# Altium schematic symbol library SignalCommunications.SCHLIB: 804 symbols (part 1 of 9) (continued)
## WE-DDF
designator L?, comment <b>SEPIC SMD Power Transformer WE-DDF</b><br><br> / - Extremely flat<br> / - 1:1 transformer<br> / - Double inductor with two identical windings<br><br> / -- SEPIC-switching regulators<br> / -- Switching regulators with second, / unregulated output voltage
footprint WE-DDF_744876...
pins: 1 3, 2 1, 3 2, 4

## WE-DSL_7505101...
designator T?, comment <b>SMD-VDSL Transformer WE-DSL</b><p> / - IEC60950 compatible<br><br> / -- for VDSL applications<br> / -- Matched to various manufacturers VDSL ICs
footprint WE_EP7_SMD_8PIN
pins: 1, 2, 3, 4, 5, 6, 7, 8

## WE-DSL_75005153X
designator T?, comment <b>SMD-ADSL Transformer WE-DSL</b><p> / - IEC60950 compatible<br><br> / -- for ADSL applications<br> / -- Matched to various manufacturers ADSL ICs
footprint WE_EP7_SMD_8PIN
pins: 1, 2, 3, 4, 5, 6, 7, 8

## WE-DSL_750050702
designator T?, comment <b>SMD-ADSL Transformer WE-DSL</b><p> / - IEC60950 compatible<br><br> / -- for ADSL applications<br> / -- Matched to various manufacturers ADSL ICs
footprint WE_EP13_SMD_9PIN
pins: 1, 2, 4, 5, 6, 7, 8, 9, 10

## WE-DSL_750050772_750051256
designator T?, comment <b>SMD-HDSL Transformer WE-DSL</b><p> / - IEC60950 compatible<br><br> / -- for HDSL applications<br> / -- Matched to various manufacturers HDSL ICs
footprint WE_EP13_THT_9PIN
pins: 1, 2, 4, 5, 6, 7, 8, 9, 10

## WE-DSL_750051062_750051576
designator T?, comment <b>SMD-HDSL Transformer WE-DSL</b><p> / - IEC60950 compatible<br><br> / -- for HDSL applications<br> / -- Matched to various manufacturers HDSL ICs
footprint WE_EP13_SMD_9PIN
pins: 1, 2, 4, 5, 6, 7, 8, 9, 10

## WE-DSL_750051433
designator T?, comment <b>SMD-SHDSL Transformer WE-DSL</b><p> / - IEC60950 compatible<br><br> / -- for SHDSL applications<br> / -- Matched to various manufacturers SHDSL ICs
footprint WE_EP13_THT_9PIN
pins: 1, 2, 4, 5, 6, 7, 8, 9, 10

## WE-DSL_750051719
designator T?, comment <b>SMD-SHDSL Transformer WE-DSL</b><p> / - IEC60950 compatible<br><br> / -- for SHDSL applications<br> / -- Matched to various manufacturers SHDSL ICs
footprint WE_EPX9_SMD_8PIN
pins: 1, 2, 3, 4, 5, 6, 7, 8

## WE-DSL_750051786_7500521..
designator T?, comment <b>SMD-ADSL Transformer WE-DSL</b><p> / - IEC60950 compatible<br><br> / -- for ADSL applications<br> / -- Matched to various manufacturers ADSL ICs
footprint WE_EP13_SMD_12PIN
pins: 1, 2, 3, 4, 5, 6, 7, 8, 9, 10, 14 11, 16 12

## WE-EHPI
designator L?, comment <b>Energy Harvesting Coupled Inductor WE-EHPI</b><p> / - Low profile: 4 mm <br> / - Small footprint 6 x 6 mm <br> / - Very low secondary RDC<br> / - Multiple options of turn ratios available <br> / - Separated welding/soldering pads for increased reliability<br> / - Optimized winding technology for increased performance & reliability<br> / <br> / - Wireless fire, alarm, gas and metering remote sensors driven by environmental energies based on energy harvesting <br> / - Sensors with predictive battery replacements in applications which are difficult to access <br> / - Energy self-sufficient supply using subsequent installed sensors for energy harvesting <br>
MANUFACTURER: Würth Elektronik eiSos GmbH; CREATED-BY: Christin Otto; COMPANY-URL: http://we-online.de; CREATED-DATE: March 2013; DATASHEET-URL: http://katalog.we-online.de/de/pbs/WE-EHPI?sid=1d9d32b2a9
footprint WE-EHPI
pins: 1 3, 2 4, 3 2, 4 1

## WE-FB_LT35XX/LT3748_EP5_EP5
designator T?, comment <b>Flyback Converter WE-FB for LT35xx / LT3748</b><p> / - Input voltage: 8-15 V<br> / - Output power: <10 W<br> / - Isolation voltage: 2.5 kV<br> / - designd for LT35xx / LT3748<br><br> / -- Industrial input voltage
footprint WE_EP5_SMD_6PIN
pins: 1, 3, 4, 6

## WE-FB_LT3573_WE-FB_750370047
designator T?, comment <b>Flyback Converter WE-FB for LT3573</b><p> / - Input voltage: 24 V<br> / - Output power: 5 W<br> / - Isolation voltage: 1.5 kV<br> / - designd for LT3573<br><br> / -- Industrial input voltage
footprint WE_EP7*_750370047
pins: 1, 2, 3, 4, 5, 6, 7, 8

## WE-FB_LT3573_WE-FB_750370058_750370059
designator T?, comment <b>Flyback Converter WE-FB for LT3573</b><p> / - Input voltage: 24 V<br> / - Output power: 5 W<br> / - Isolation voltage: 1.5 kV<br> / - designd for LT3573<br><br> / -- Industrial input voltage
footprint WE_EP7*_750370058_750370059
pins: 1, 2, 3, 4, 5, 6, 7, 8

## WE-FB_LT3573_WE-FB_EP7
designator T?, comment <b>Flyback Converter WE-FB for LT3573</b><p> / - Input voltage: 24 V<br> / - Output power: 5 W<br> / - Isolation voltage: 1.5 kV<br> / - designd for LT3573<br><br> / -- Industrial input voltage
footprint WE_EP7_SMD_8PIN
pins: 1, 2, 3, 4, 5, 6, 7, 8

## WE-FB_LT3573_WE-FB_EP10
designator T?, comment <b>Flyback Converter WE-FB for LT3573</b><p> / - Input voltage: 24 V<br> / - Output power: 5 W<br> / - Isolation voltage: 1.5 kV<br> / - designd for LT3573<br><br> / -- Industrial input voltage
footprint WE_EP10_SMD_8PIN
pins: 1, 2, 3, 4, 5, 6, 7, 8

## WE-FB_LT3573_WE-FB_ER9.5
designator T?, comment <b>Flyback Converter WE-FB for LT3573</b><p> / - Input voltage: 24 V<br> / - Output power: 5 W<br> / - Isolation voltage: 1.5 kV<br> / - designd for LT3573<br><br> / -- Industrial input voltage
footprint WE_ER9.5_SMD_8PIN
pins: 1 4, 2 3, 3 2, 4 1, 5 8, 6 7, 7 6, 8 5

## WE-FB_LT3751_EE35/18/10
designator T?, comment <b>Flyback Converter WE-FB for LT3751</b><p> / - designd for LT3751<br><br>
footprint WE_EE35/18/10_THT_HORIZONTAL_14PIN
pins: 1, 2, 3, 4, 5, 6, 7, 8, 9, 10, 11, 12, 13, 14

## WE-FB_LT3751_EFD20
designator T?, comment <b>Flyback Converter WE-FB for LT3751</b><p> / - designd for LT3751<br><br>
footprint WE_EFD20_SMD_10PIN
pins: 1, 2, 3, 4, 5, 6, 7, 8, 9, 10

## WE-FC_ET
designator L?, comment <b>Current Compensated Power Line Choke WE-FC</b><p> / - Closed rectangular ferrit core<br> / - 2-section winding for excellent high frequency performance<br> / - 1% stray inductance for symmetrical interference suppression<br> / - Recyclable due to no encapsulation<br> / - Rated voltage 250 VAC<br> / - Isolation voltage 2000 VAC<br><br> / -- Switch mode power supplies<br> / -- Electronic ballasts for lamps
footprint WE-FC_ET
pins: 1 3, 2 4, 3 2, 4 1

## WE-FC_UT
designator L?, comment <b>Current Compensated Power Line Choke WE-FC</b><p> / - Closed rectangular ferrit core<br> / - 2-section winding for excellent high frequency performance<br> / - 1% stray inductance for symmetrical interference suppression<br> / - Recyclable due to no encapsulation<br> / - Rated voltage 250 VAC<br> / - Isolation voltage 2000 VAC<br><br> / -- Switch mode power supplies<br> / -- Electronic ballasts for lamps
footprint WE-FC_UT
pins: 1 3, 2 4, 3 2, 4 1

## WE-FLEX+_ETD29
designator T?, comment <b>FLEX-Transformer WE-FLEX+</b><p> / - Transformer with 6 windings<br> / - Power up to 300W / - Insulation voltage 500 VDC<br> / - Low leakage inductance<br><br> / -- For all kinds of switching regulators: Flyback converters, Forward converters, Push- pull converters, SEPIC converter
footprint WE_ETD29_THT_14PIN
pins: 1 9, 2 11, 3 1, 5 3, 6 5, 7, 8, 9 6, 10 4, 12 2, 13 12, 14 10

## WE-FLEX+_ETD34
designator T?, comment <b>FLEX-Transformer WE-FLEX+</b><p> / - Transformer with 6 windings<br> / - Power up to 300W / - Insulation voltage 500 VDC<br> / - Low leakage inductance<br><br> / -- For all kinds of switching regulators: Flyback converters, Forward converters, Push- pull converters, SEPIC converter
footprint WE_ETD34_THT_14PIN
pins: 1 9, 2 11, 3 1, 5 3, 6 5, 7, 8, 9 6, 10 4, 12 2, 13 12, 14 10

## WE-FLEX+_ETD39
designator T?, comment <b>FLEX-Transformer WE-FLEX+</b><p> / - Transformer with 6 windings<br> / - Power up to 300W / - Insulation voltage 500 VDC<br> / - Low leakage inductance<br><br> / -- For all kinds of switching regulators: Flyback converters, Forward converters, Push- pull converters, SEPIC converter
footprint WE_ETD39_THT_16PIN
pins: 2 9, 3 11, 4 1, 5 3, 6 5, 7, 10 8, 11 6, 12 4, 13 2, 14 12, 15 10

## WE-FLEX_EFD15
designator T?, comment <b>FLEX-Transformer WE-FLEX</b><p> / Transformer with 6 windings<br> / - 4 sizes with 5 different lengths of air gap each<br> / - Insulation voltage 500 VDC<br> / - Low leakage inductance<br><br> / -- By using different circuits more than 300 transformer solutions and about 100 choke solution possible <br> / -- For all kinds of switching regulators: Flyback converters, Forward converters, Push- pull converters, SEPIC converter
footprint WE_EFD15_SMD_12PIN
pins: 1, 2 3, 3 5, 4 7, 5 9, 6 11, 7 12, 8 10, 9 8, 10 6, 11 4, 12 2

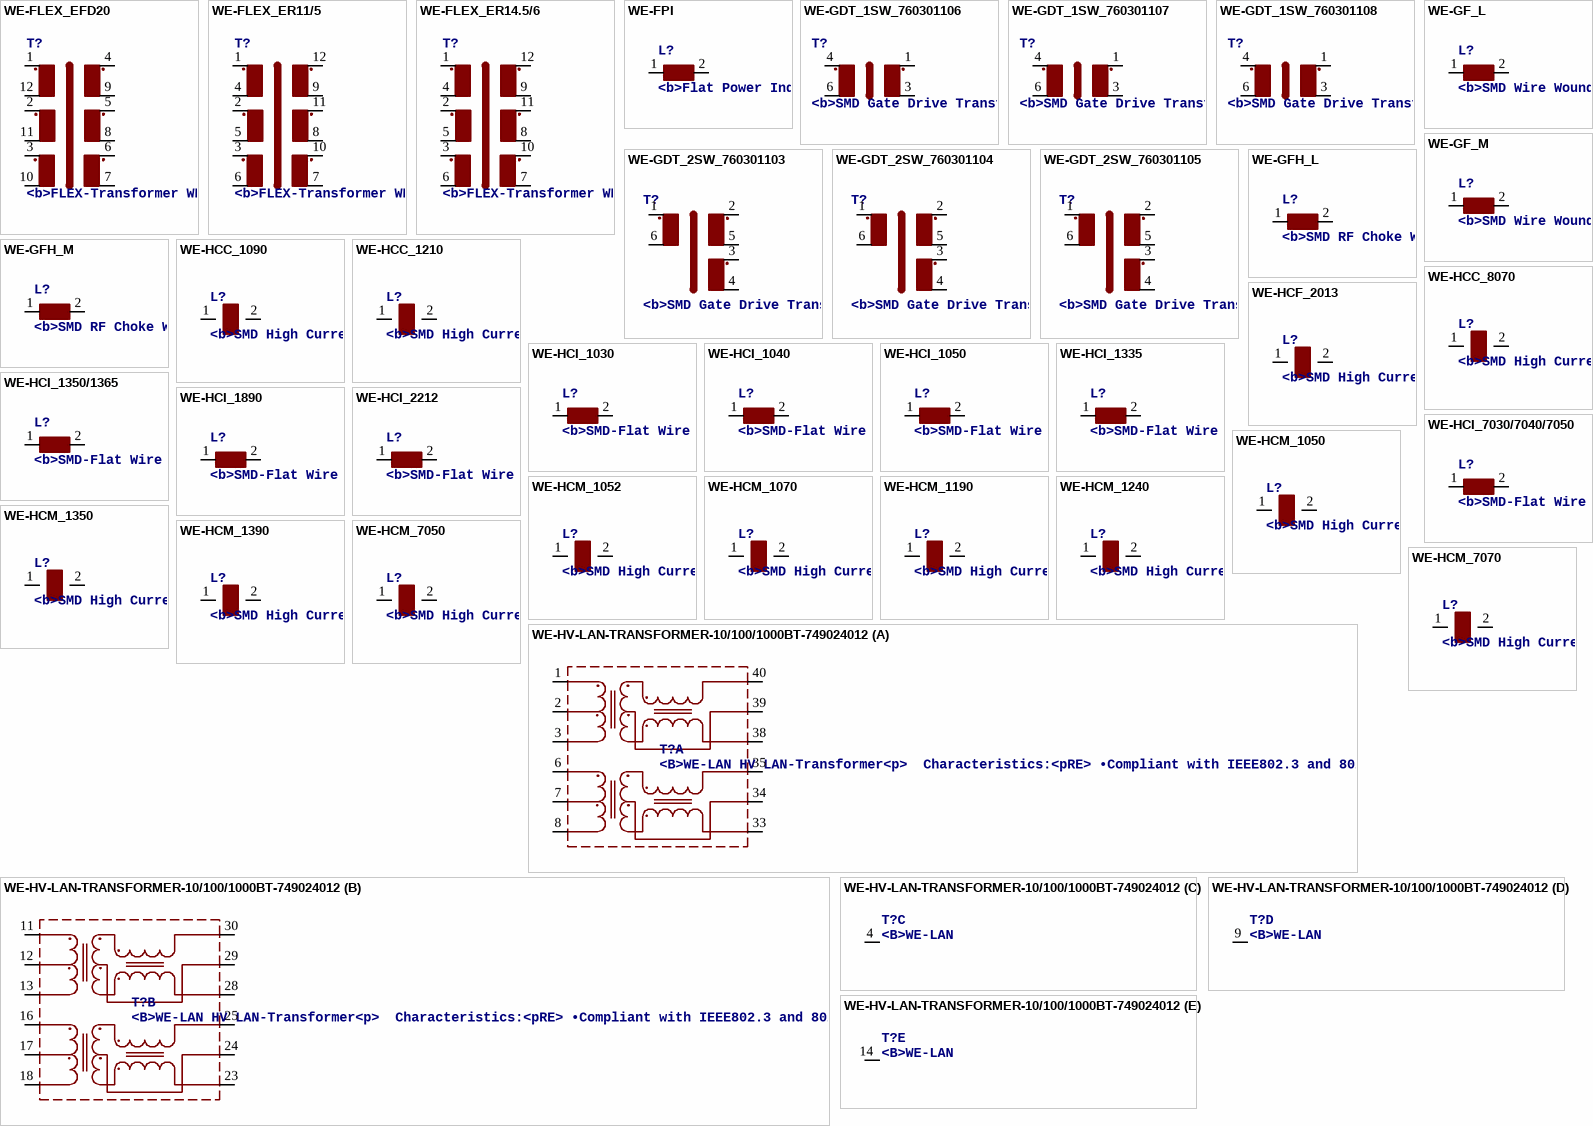
[diagram p2: symbols WE-FLEX_EFD20 to WE-HV-LAN-TRANSFORMER-10/100/1000BT-749024012]

## WE-FLEX_EFD20
designator T?, comment <b>FLEX-Transformer WE-FLEX</b><p> / Transformer with 6 windings<br> / - 4 sizes with 5 different lengths of air gap each<br> / - Insulation voltage 500 VDC<br> / - Low leakage inductance<br><br> / -- By using different circuits more than 300 transformer solutions and about 100 choke solution possible <br> / -- For all kinds of switching regulators: Flyback converters, Forward converters, Push- pull converters, SEPIC converter
footprint WE_EFD20_SMD_12PIN
pins: 1, 2 3, 3 5, 4 7, 5 9, 6 11, 7 12, 8 10, 9 8, 10 6, 11 4, 12 2

## WE-FLEX_ER11/5
designator T?, comment <b>FLEX-Transformer WE-FLEX</b><p> / Transformer with 6 windings<br> / - 4 sizes with 5 different lengths of air gap each<br> / - Insulation voltage 500 VDC<br> / - Low leakage inductance<br><br> / -- By using different circuits more than 300 transformer solutions and about 100 choke solution possible <br> / -- For all kinds of switching regulators: Flyback converters, Forward converters, Push- pull converters, SEPIC converter
footprint WE_ER11/5_SMD_12PIN
pins: 1, 2 3, 3 5, 4 2, 5 4, 6, 7 12, 8 10, 9 8, 10 11, 11 9, 12 7

## WE-FLEX_ER14.5/6
designator T?, comment <b>FLEX-Transformer WE-FLEX</b><p> / Transformer with 6 windings<br> / - 4 sizes with 5 different lengths of air gap each<br> / - Insulation voltage 500 VDC<br> / - Low leakage inductance<br><br> / -- By using different circuits more than 300 transformer solutions and about 100 choke solution possible <br> / -- For all kinds of switching regulators: Flyback converters, Forward converters, Push- pull converters, SEPIC converter
footprint WE_ER14.5/6_SMD_12PIN
pins: 1, 2 3, 3 5, 4 2, 5 4, 6, 7 12, 8 10, 9 8, 10 11, 11 9, 12 7

## WE-FPI
designator L?, comment <b>Flat Power Inductor WE-FPI</b><br><br> / - Extremely flat power inductor <= 1,1 mm<br> / - High current capability<br> / -- Portable power like PDA, digital camera, / PCMICA-cards and displays<br> / -- DC/DC-converter<br> / -- Recommended for switching regulator IC's from / Linear Technology, National Semiconductor, / Texas Instruments and Fairchild Semiconductor
footprint WE-FPI_744010...
pins: 1, 2

## WE-GDT_1SW_760301106
designator T?, comment <b>SMD Gate Drive Transformer WE-GDT</b><br><br> / - small form factor EP5<br> / - 1 or 2 secondary windings<br> / - 4 different turn rations<br> / - 1500VDC insulation test voltage<br> / - operating voltage up to 80V<br><br> / -- Gate Drive<br> / -- Signal<br> / -- Power<br> / -- Synchronous Flyback
footprint WE_EP5_SMD_6PIN
pins: 1 6, 3 4, 4 1, 6 3

## WE-GDT_1SW_760301107
designator T?, comment <b>SMD Gate Drive Transformer WE-GDT</b><br><br> / - small form factor EP5<br> / - 1 or 2 secondary windings<br> / - 4 different turn rations<br> / - 1500VDC insulation test voltage<br> / - operating voltage up to 80V<br><br> / -- Gate Drive<br> / -- Signal<br> / -- Power<br> / -- Synchronous Flyback
footprint WE_EP5_SMD_6PIN
pins: 1 6, 3 4, 4 1, 6 3

## WE-GDT_1SW_760301108
designator T?, comment <b>SMD Gate Drive Transformer WE-GDT</b><br><br> / - small form factor EP5<br> / - 1 or 2 secondary windings<br> / - 4 different turn rations<br> / - 1500VDC insulation test voltage<br> / - operating voltage up to 80V<br><br> / -- Gate Drive<br> / -- Signal<br> / -- Power<br> / -- Synchronous Flyback
footprint WE_EP5_SMD_6PIN
pins: 1 6, 3 4, 4 1, 6 3

## WE-GDT_2SW_760301103
designator T?, comment <b>SMD Gate Drive Transformer WE-GDT</b><br><br> / - small form factor EP5<br> / - 1 or 2 secondary windings<br> / - 4 different turn rations<br> / - 1500VDC insulation test voltage<br> / - operating voltage up to 80V<br><br> / -- Gate Drive<br> / -- Signal<br> / -- Power<br> / -- Synchronous Flyback
footprint WE_EP5_SMD_6PIN
pins: 1, 2 3, 3 5, 4 6, 5 4, 6 2

## WE-GDT_2SW_760301104
designator T?, comment <b>SMD Gate Drive Transformer WE-GDT</b><br><br> / - small form factor EP5<br> / - 1 or 2 secondary windings<br> / - 4 different turn rations<br> / - 1500VDC insulation test voltage<br> / - operating voltage up to 80V<br><br> / -- Gate Drive<br> / -- Signal<br> / -- Power<br> / -- Synchronous Flyback
footprint WE_EP5_SMD_6PIN
pins: 1, 2 3, 3 5, 4 6, 5 4, 6 2

## WE-GDT_2SW_760301105
designator T?, comment <b>SMD Gate Drive Transformer WE-GDT</b><br><br> / - small form factor EP5<br> / - 1 or 2 secondary windings<br> / - 4 different turn rations<br> / - 1500VDC insulation test voltage<br> / - operating voltage up to 80V<br><br> / -- Gate Drive<br> / -- Signal<br> / -- Power<br> / -- Synchronous Flyback
footprint WE_EP5_SMD_6PIN
pins: 1, 2 3, 3 5, 4 6, 5 4, 6 2

## WE-GF_L
designator L?, comment <b>SMD Wire Wound Inductor WE-GF</b><p> / - Wire wound ferrite<br> / - High resistance against dampness<br> / - 5% tolerance is available upon request<p> / -- HF-circuits like tuner, transponder etc.<br> / -- HF amplifier circuits like antennas amplifier<br> / -- Oscillator<br> / -- Filter circuits<br> / -- Amplification circuits
footprint WE-GF_L
pins: 1, 2

## WE-GF_M
designator L?, comment <b>SMD Wire Wound Inductor WE-GF</b><p> / - Wire wound ferrite<br> / - High resistance against dampness<br> / - 5% tolerance is available upon request<p> / -- HF-circuits like tuner, transponder etc.<br> / -- HF amplifier circuits like antennas amplifier<br> / -- Oscillator<br> / -- Filter circuits<br> / -- Amplification circuits
footprint WE-GF_M
pins: 1, 2

## WE-GFH_L
designator L?, comment <b>SMD RF Choke WE-GFH</b><p> / - Wire wound ferrite<br> / - For higher currents<p> / -- HF-circuits like tuner, transponder etc.
footprint WE-GFH_L
pins: 1, 2

## WE-GFH_M
designator L?, comment <b>SMD RF Choke WE-GFH</b><p> / - Wire wound ferrite<br> / - For higher currents<p> / -- HF-circuits like tuner, transponder etc.
footprint WE-GFH_M
pins: 1, 2

## WE-HCC_1090
designator L?, comment <b>SMD High Current Cube Inductor WE-HCC</b><br><br> / - magnetically shieled<br> / - current capability up to 27A<br> / - excellent saturation characteristics<br><br> / -- filter choke for DC/DC converter<br> / -- single and polyphase buck converter<br> / -- filter choke for motor electronics
footprint WE-HCC_1090
pins: 1, 2

## WE-HCC_1210
designator L?, comment <b>SMD High Current Cube Inductor WE-HCC</b><br><br> / - magnetically shieled<br> / - current capability up to 27A<br> / - excellent saturation characteristics<br><br> / -- filter choke for DC/DC converter<br> / -- single and polyphase buck converter<br> / -- filter choke for motor electronics
footprint WE-HCC_1210
pins: 1, 2

## WE-HCC_8070
designator L?, comment <b>SMD High Current Cube Inductor WE-HCC</b><br><br> / - magnetically shieled<br> / - current capability up to 27A<br> / - excellent saturation characteristics<br><br> / -- filter choke for DC/DC converter<br> / -- single and polyphase buck converter<br> / -- filter choke for motor electronics
footprint WE-HCC_8070
pins: 1, 2

## WE-HCF_2013
designator L?, comment <b>SMD High Currenr Inductor WE-HCF </b><p> / - Flat wire coil for lower losses at high frequency ranges<br> / - Core material: NiZn<br> / - Shielded ferrite construction<br><br> / -- Polyphase-switching regulators<br> / -- Multiphase-switching regulators<br> / -- High temperature electronics<br> / -- Graphic cards<br> / -- Motherboards <br> / -- Laptops<br>
footprint WE-HCF_2013
pins: 1, 2

## WE-HCI_1030
designator L?, comment <b>SMD-Flat Wire High Current Inductor WE-HCI</b><p> / - Flat wire coil for lower losses at high frequency ranges<br> / - Low leakage field <br> / - Extremely low profile design<br> / - Current loading up to 40 A<br> / - Magnetically shielded<p> / -- Graphic cards<br> / -- Laptops<br> / -- Motherboards<br> / -- High current switching regulators<br> / -- Polyphase-switching regulators<br> / -- industrial computers<br>
footprint WE-HCI_1030
pins: 1, 2

## WE-HCI_1040
designator L?, comment <b>SMD-Flat Wire High Current Inductor WE-HCI</b><p> / - Flat wire coil for lower losses at high frequency ranges<br> / - Low leakage field <br> / - Extremely low profile design<br> / - Current loading up to 40 A<br> / - Magnetically shielded<p> / -- Graphic cards<br> / -- Laptops<br> / -- Motherboards<br> / -- High current switching regulators<br> / -- Polyphase-switching regulators<br> / -- industrial computers<br>
footprint WE-HCI_1040
pins: 1, 2

## WE-HCI_1050
designator L?, comment <b>SMD-Flat Wire High Current Inductor WE-HCI</b><p> / - Flat wire coil for lower losses at high frequency ranges<br> / - Low leakage field <br> / - Extremely low profile design<br> / - Current loading up to 40 A<br> / - Magnetically shielded<p> / -- Graphic cards<br> / -- Laptops<br> / -- Motherboards<br> / -- High current switching regulators<br> / -- Polyphase-switching regulators<br> / -- industrial computers<br>
footprint WE-HCI_1050
pins: 1, 2

## WE-HCI_1335
designator L?, comment <b>SMD-Flat Wire High Current Inductor WE-HCI</b><p> / - Flat wire coil for lower losses at high frequency ranges<br> / - Low leakage field <br> / - Extremely low profile design<br> / - Current loading up to 40 A<br> / - Magnetically shielded<p> / -- Graphic cards<br> / -- Laptops<br> / -- Motherboards<br> / -- High current switching regulators<br> / -- Polyphase-switching regulators<br> / -- industrial computers<br>
footprint WE-HCI_1335
pins: 1, 2

## WE-HCI_1350/1365
designator L?, comment <b>SMD-Flat Wire High Current Inductor WE-HCI</b><p> / - Flat wire coil for lower losses at high frequency ranges<br> / - Low leakage field <br> / - Extremely low profile design<br> / - Current loading up to 40 A<br> / - Magnetically shielded<p> / -- Graphic cards<br> / -- Laptops<br> / -- Motherboards<br> / -- High current switching regulators<br> / -- Polyphase-switching regulators<br> / -- industrial computers<br>
footprint WE-HCI_1350/1365
pins: 1, 2

## WE-HCI_1890
designator L?, comment <b>SMD-Flat Wire High Current Inductor WE-HCI</b><p> / - Flat wire coil for lower losses at high frequency ranges<br> / - Low leakage field <br> / - Extremely low profile design<br> / - Current loading up to 40 A<br> / - Magnetically shielded<p> / -- Graphic cards<br> / -- Laptops<br> / -- Motherboards<br> / -- High current switching regulators<br> / -- Polyphase-switching regulators<br> / -- industrial computers<br>
footprint WE-HCI_1890
pins: 1, 2

## WE-HCI_2212
designator L?, comment <b>SMD-Flat Wire High Current Inductor WE-HCI</b><p> / - Flat wire coil for lower losses at high frequency ranges<br> / - Low leakage field <br> / - Extremely low profile design<br> / - Current loading up to 40 A<br> / - Magnetically shielded<p> / -- Graphic cards<br> / -- Laptops<br> / -- Motherboards<br> / -- High current switching regulators<br> / -- Polyphase-switching regulators<br> / -- industrial computers<br>
footprint WE-HCI_2212
pins: 1, 2

## WE-HCI_7030/7040/7050
designator L?, comment <b>SMD-Flat Wire High Current Inductor WE-HCI</b><p> / - Flat wire coil for lower losses at high frequency ranges<br> / - Low leakage field <br> / - Extremely low profile design<br> / - Current loading up to 40 A<br> / - Magnetically shielded<p> / -- Graphic cards<br> / -- Laptops<br> / -- Motherboards<br> / -- High current switching regulators<br> / -- Polyphase-switching regulators<br> / -- industrial computers<br>
footprint WE-HCI_7030/7040/7050
pins: 1, 2

## WE-HCM_1050
designator L?, comment <b>SMD High Current Flat Wire Inductor WE-HCM</b><p> / - Extremely low DC-resistance<br> / - Special design for low EMI-noise<br> / - Stable inductance at high DC-currents<br> / - Low temperature rise at high DC-currents<br> / - High saturation current up to 60A <br><br> / -- Polyphase switching regulator<br> / -- Multiphase switching regulator<br> / -- CPU / RAM power spply<br> / -- Power PC<br>
footprint WE-HCM_1050
pins: 1, 2

## WE-HCM_1052
designator L?, comment <b>SMD High Current Flat Wire Inductor WE-HCM</b><p> / - Extremely low DC-resistance<br> / - Special design for low EMI-noise<br> / - Stable inductance at high DC-currents<br> / - Low temperature rise at high DC-currents<br> / - High saturation current up to 60A <br><br> / -- Polyphase switching regulator<br> / -- Multiphase switching regulator<br> / -- CPU / RAM power spply<br> / -- Power PC<br>
footprint WE-HCM_1052
pins: 1, 2

## WE-HCM_1070
designator L?, comment <b>SMD High Current Flat Wire Inductor WE-HCM</b><p> / - Extremely low DC-resistance<br> / - Special design for low EMI-noise<br> / - Stable inductance at high DC-currents<br> / - Low temperature rise at high DC-currents<br> / - High saturation current up to 60A <br><br> / -- Polyphase switching regulator<br> / -- Multiphase switching regulator<br> / -- CPU / RAM power spply<br> / -- Power PC<br>
footprint WE-HCM_1070
pins: 1, 2

## WE-HCM_1190
designator L?, comment <b>SMD High Current Flat Wire Inductor WE-HCM</b><p> / - Extremely low DC-resistance<br> / - Special design for low EMI-noise<br> / - Stable inductance at high DC-currents<br> / - Low temperature rise at high DC-currents<br> / - High saturation current up to 60A <br><br> / -- Polyphase switching regulator<br> / -- Multiphase switching regulator<br> / -- CPU / RAM power spply<br> / -- Power PC<br>
footprint WE-HCM_1190
pins: 1, 2

## WE-HCM_1240
designator L?, comment <b>SMD High Current Flat Wire Inductor WE-HCM</b><p> / - Extremely low DC-resistance<br> / - Special design for low EMI-noise<br> / - Stable inductance at high DC-currents<br> / - Low temperature rise at high DC-currents<br> / - High saturation current up to 60A <br><br> / -- Polyphase switching regulator<br> / -- Multiphase switching regulator<br> / -- CPU / RAM power spply<br> / -- Power PC<br>
footprint WE-HCM_1240
pins: 1, 2

## WE-HCM_1350
designator L?, comment <b>SMD High Current Flat Wire Inductor WE-HCM</b><p> / - Extremely low DC-resistance<br> / - Special design for low EMI-noise<br> / - Stable inductance at high DC-currents<br> / - Low temperature rise at high DC-currents<br> / - High saturation current up to 60A <br><br> / -- Polyphase switching regulator<br> / -- Multiphase switching regulator<br> / -- CPU / RAM power spply<br> / -- Power PC<br>
footprint WE-HCM_1350
pins: 1, 2

## WE-HCM_1390
designator L?, comment <b>SMD High Current Flat Wire Inductor WE-HCM</b><p> / - Extremely low DC-resistance<br> / - Special design for low EMI-noise<br> / - Stable inductance at high DC-currents<br> / - Low temperature rise at high DC-currents<br> / - High saturation current up to 60A <br><br> / -- Polyphase switching regulator<br> / -- Multiphase switching regulator<br> / -- CPU / RAM power spply<br> / -- Power PC<br>
footprint WE-HCM_1390
pins: 1, 2

## WE-HCM_7050
designator L?, comment <b>SMD High Current Flat Wire Inductor WE-HCM</b><p> / - Extremely low DC-resistance<br> / - Special design for low EMI-noise<br> / - Stable inductance at high DC-currents<br> / - Low temperature rise at high DC-currents<br> / - High saturation current up to 60A <br><br> / -- Polyphase switching regulator<br> / -- Multiphase switching regulator<br> / -- CPU / RAM power spply<br> / -- Power PC<br>
footprint WE-HCM_7050
pins: 1, 2

## WE-HCM_7070
designator L?, comment <b>SMD High Current Flat Wire Inductor WE-HCM</b><p> / - Extremely low DC-resistance<br> / - Special design for low EMI-noise<br> / - Stable inductance at high DC-currents<br> / - Low temperature rise at high DC-currents<br> / - High saturation current up to 60A <br><br> / -- Polyphase switching regulator<br> / -- Multiphase switching regulator<br> / -- CPU / RAM power spply<br> / -- Power PC<br>
footprint WE-HCM_7070
pins: 1, 2

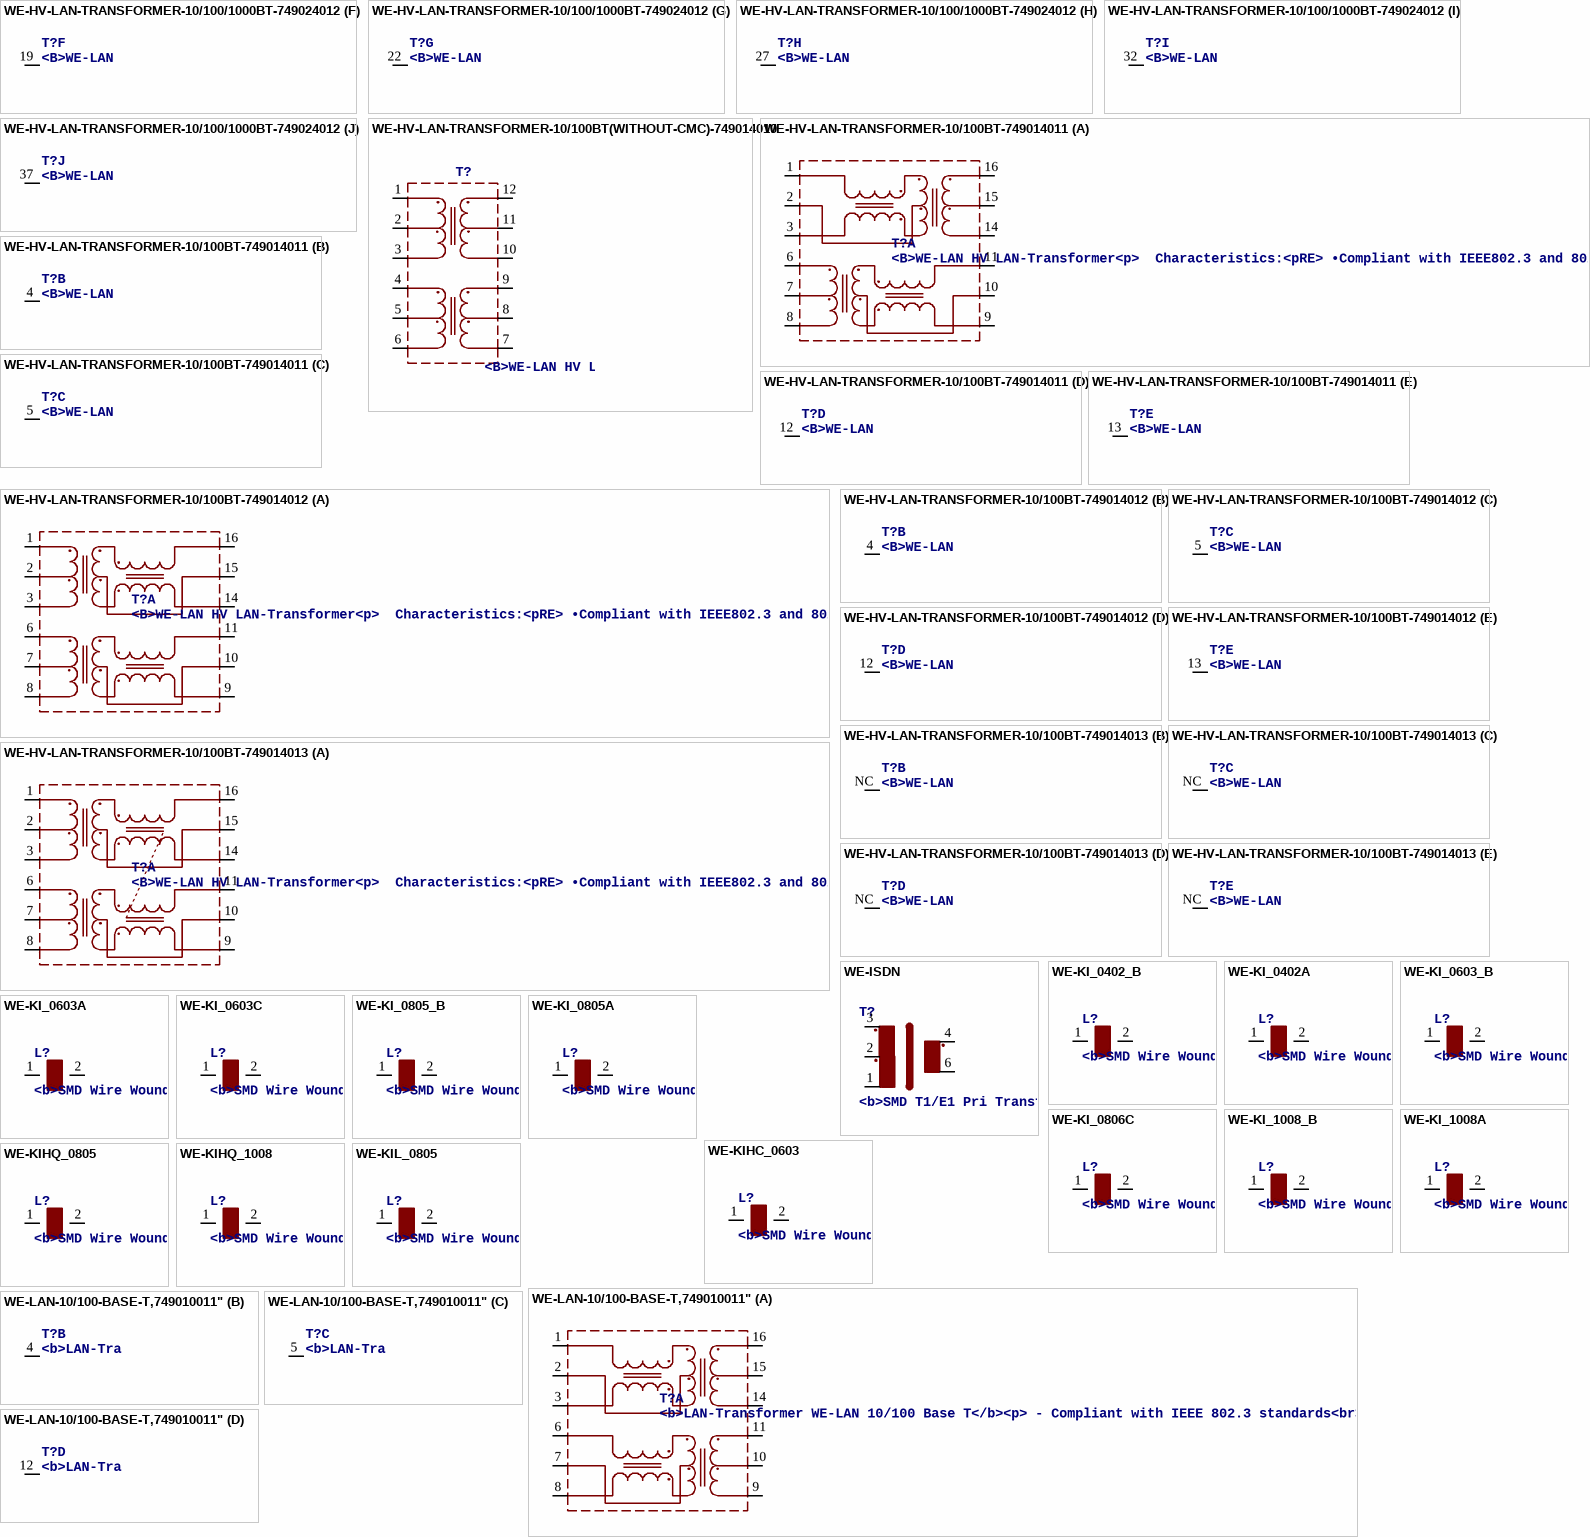
[diagram p3: symbols WE-HV-LAN-TRANSFORMER-10/100/1000BT-749024012 to WE-LAN-10/100-BASE-T,749010011"]